# Altium footprint library iv_footprints.PcbLib: 724 footprints (part 42 of 46)
Each footprint in its own frame and in the unit in brackets; x right, y up, seen from the top. Pads: shape width x height; smd on the part's side, far side on the other; paste and mask are expansions set on the pad; w line width, h text height; cw(c..) or ccw(c..) is an arc to the next point about the centre after c.
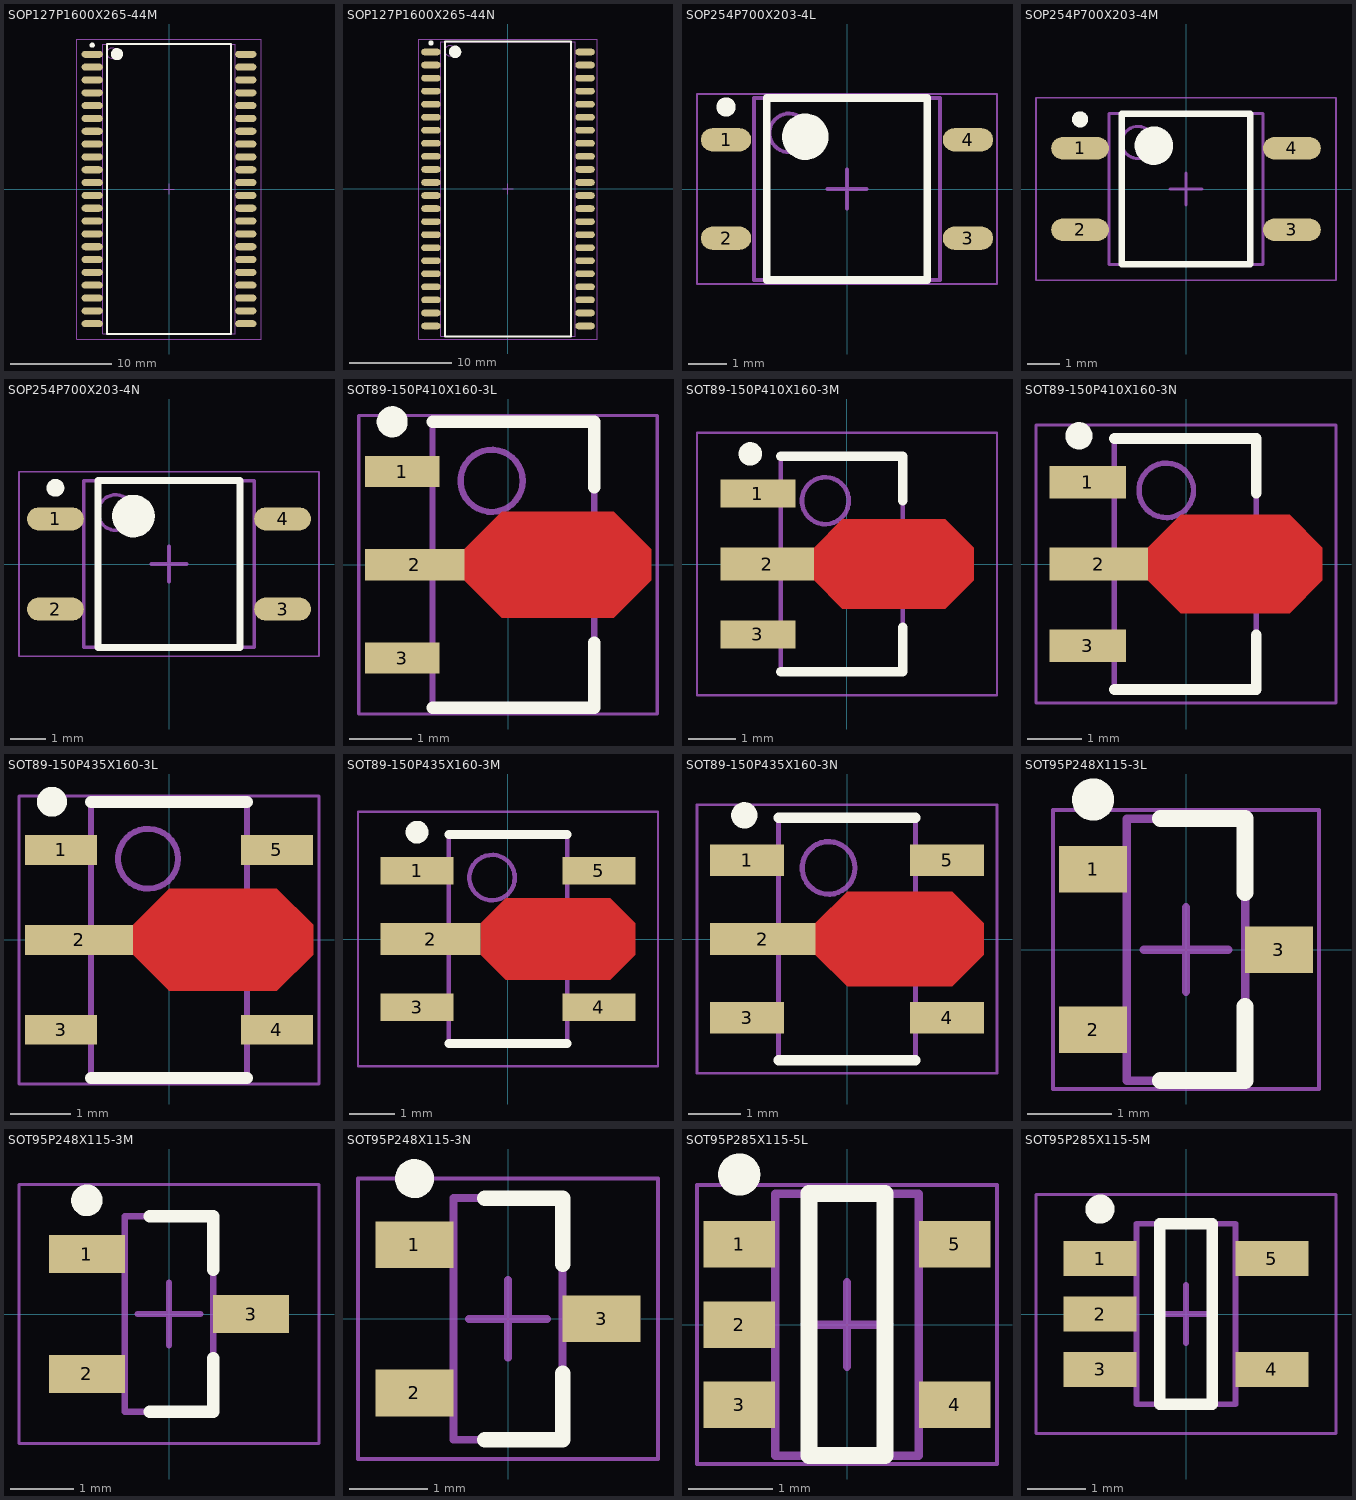
[diagram p41: the footprints below, top view; thin cyan lines are the x and y axes]

## SOP127P1600X265-44M [mm] "SOP, 44-Leads, Body 28.45x13.00mm, Pitch 1.27mm, IPC Low Density"
height 2.65
pads (44):
  oval 2.1x0.7 smd: 1(-7.6,13.335) 2(-7.6,12.065) 3(-7.6,10.795) 4(-7.6,9.525) 5(-7.6,8.255) 6(-7.6,6.985) 7(-7.6,5.715) 8(-7.6,4.445) 9(-7.6,3.175) 10(-7.6,1.905) 11(-7.6,0.635) 12(-7.6,-0.635) 13(-7.6,-1.905) 14(-7.6,-3.175) 15(-7.6,-4.445) 16(-7.6,-5.715) 17(-7.6,-6.985) 18(-7.6,-8.255) 19(-7.6,-9.525) 20(-7.6,-10.795) 21(-7.6,-12.065) 22(-7.6,-13.335) 23(7.6,-13.335) 24(7.6,-12.065) 25(7.6,-10.795) 26(7.6,-9.525) 27(7.6,-8.255) 28(7.6,-6.985) 29(7.6,-5.715) 30(7.6,-4.445) 31(7.6,-3.175) 32(7.6,-1.905) 33(7.6,-0.635) 34(7.6,0.635) 35(7.6,1.905) 36(7.6,3.175) 37(7.6,4.445) 38(7.6,5.715) 39(7.6,6.985) 40(7.6,8.255) 41(7.6,9.525) 42(7.6,10.795) 43(7.6,12.065) 44(7.6,13.335)
Top Overlay:
  circle w0.25: c-7.6,14.235 r0.125
  circle w0.6: c-5.15,13.35 r0.3
  lines w0.2: -6.15,-14.35 -6.15,14.35 6.15,14.35 6.15,-14.35 -6.15,-14.35
Mechanical 13:
  circle w0.1: c-5.65,13.45 r0.5
  lines w0.1: -6.55,-14.35 -6.55,14.35 6.55,14.35 6.55,-14.35 -6.55,-14.35
Mechanical 15:
  lines w0.05: -9.15,-14.85 -9.15,14.85 9.15,14.85 9.15,-14.85 -9.15,-14.85
  lines w0.1: -0.5,0 0.5,0 ; 0,-0.5 0,0.5
3D body "SOP127P1600X265-44M.step": height 2.65, standoff 0, extent -8,-14.35 8,14.35

## SOP127P1600X265-44N [mm] "SOP, 44-Leads, Body 28.45x13.00mm, Pitch 1.27mm, IPC Medium Density"
height 2.65
pads (44):
  oval 1.9x0.65 smd: 1(-7.5,13.335) 2(-7.5,12.065) 3(-7.5,10.795) 4(-7.5,9.525) 5(-7.5,8.255) 6(-7.5,6.985) 7(-7.5,5.715) 8(-7.5,4.445) 9(-7.5,3.175) 10(-7.5,1.905) 11(-7.5,0.635) 12(-7.5,-0.635) 13(-7.5,-1.905) 14(-7.5,-3.175) 15(-7.5,-4.445) 16(-7.5,-5.715) 17(-7.5,-6.985) 18(-7.5,-8.255) 19(-7.5,-9.525) 20(-7.5,-10.795) 21(-7.5,-12.065) 22(-7.5,-13.335) 23(7.5,-13.335) 24(7.5,-12.065) 25(7.5,-10.795) 26(7.5,-9.525) 27(7.5,-8.255) 28(7.5,-6.985) 29(7.5,-5.715) 30(7.5,-4.445) 31(7.5,-3.175) 32(7.5,-1.905) 33(7.5,-0.635) 34(7.5,0.635) 35(7.5,1.905) 36(7.5,3.175) 37(7.5,4.445) 38(7.5,5.715) 39(7.5,6.985) 40(7.5,8.255) 41(7.5,9.525) 42(7.5,10.795) 43(7.5,12.065) 44(7.5,13.335)
Top Overlay:
  circle w0.25: c-7.5,14.21 r0.125
  circle w0.6: c-5.15,13.35 r0.3
  lines w0.2: -6.15,-14.35 -6.15,14.35 6.15,14.35 6.15,-14.35 -6.15,-14.35
Mechanical 13:
  circle w0.1: c-5.65,13.45 r0.5
  lines w0.1: -6.55,-14.35 -6.55,14.35 6.55,14.35 6.55,-14.35 -6.55,-14.35
Mechanical 15:
  lines w0.05: -8.7,-14.6 -8.7,14.6 8.7,14.6 8.7,-14.6 -8.7,-14.6
  lines w0.1: -0.5,0 0.5,0 ; 0,-0.5 0,0.5
3D body "SOP127P1600X265-44N.step": height 2.65, standoff 0, extent -8,-14.35 8,14.35

## SOP254P700X203-4L [mm] "SOP, 4-Leads, Body 4.42x4.58mm, Pitch 2.54mm, IPC High Density"
height 2.03
pads (4):
  oval 1.3x0.6 smd: 1(-3.125,1.27) 2(-3.125,-1.27) 3(3.125,-1.27) 4(3.125,1.27)
Top Overlay:
  circle w0.6: c-1.075,1.35 r0.3
  circle w0.25: c-3.125,2.12 r0.125
  lines w0.2: -2.075,-2.35 2.075,-2.35 2.075,2.35 -2.075,2.35 -2.075,-2.35
Mechanical 13:
  circle w0.1: c-1.5,1.45 r0.5
  lines w0.1: -2.4,-2.35 2.4,-2.35 2.4,2.35 -2.4,2.35 -2.4,-2.35
Mechanical 15:
  lines w0.05: -3.875,-2.45 3.875,-2.45 3.875,2.45 -3.875,2.45 -3.875,-2.45
  lines w0.1: -0.5,0 0.5,0 ; 0,-0.5 0,0.5
3D body "SOP254P700X203-4L.step": height 2.03, standoff 0, extent -3.48,-2.35 3.48,2.35

## SOP254P700X203-4M [mm] "SOP, 4-Leads, Body 4.42x4.58mm, Pitch 2.54mm, IPC Low Density"
height 2.03
pads (4):
  oval 1.8x0.7 smd: 1(-3.3,1.27) 2(-3.3,-1.27) 3(3.3,-1.27) 4(3.3,1.27)
Top Overlay:
  circle w0.25: c-3.3,2.17 r0.125
  circle w0.6: c-1,1.35 r0.3
  lines w0.2: -2,-2.35 -2,2.35 2,2.35 2,-2.35 -2,-2.35
Mechanical 13:
  circle w0.1: c-1.5,1.45 r0.5
  lines w0.1: -2.4,-2.35 -2.4,2.35 2.4,2.35 2.4,-2.35 -2.4,-2.35
Mechanical 15:
  lines w0.05: -4.675,-2.85 -4.675,2.85 4.675,2.85 4.675,-2.85 -4.675,-2.85
  lines w0.1: -0.5,0 0.5,0 ; 0,-0.5 0,0.5
3D body "SOP254P700X203-4M.step": height 2.03, standoff 0, extent -3.48,-2.35 3.48,2.35

## SOP254P700X203-4N [mm] "SOP, 4-Leads, Body 4.42x4.58mm, Pitch 2.54mm, IPC Medium Density"
height 2.03
pads (4):
  oval 1.6x0.65 smd: 1(-3.2,1.27) 2(-3.2,-1.27) 3(3.2,-1.27) 4(3.2,1.27)
Top Overlay:
  circle w0.25: c-3.2,2.145 r0.125
  circle w0.6: c-1,1.35 r0.3
  lines w0.2: -2,-2.35 -2,2.35 2,2.35 2,-2.35 -2,-2.35
Mechanical 13:
  circle w0.1: c-1.5,1.45 r0.5
  lines w0.1: -2.4,-2.35 -2.4,2.35 2.4,2.35 2.4,-2.35 -2.4,-2.35
Mechanical 15:
  lines w0.05: -4.225,-2.6 -4.225,2.6 4.225,2.6 4.225,-2.6 -4.225,-2.6
  lines w0.1: -0.5,0 0.5,0 ; 0,-0.5 0,0.5
3D body "SOP254P700X203-4N.step": height 2.03, standoff 0, extent -3.48,-2.35 3.48,2.35

## SOT89-150P410X160-3L [mm] "SOT89, 3-Leads, Body 4,50x2,45mm, Pitch 1,50mm, Lead Span 4,1mm, IPC High Density"
height 1.6
pads (3):
  rect 1.2x0.5 smd: 1(-1.7,1.5) 3(-1.7,-1.5)
  rect 1.6x0.5 smd: 2(-1.5,0)
Top Layer:
  region: -0.7,0.25 -0.1,0.85 1.7,0.85 2.3,0.25 2.3,-0.25 1.7,-0.85 -0.1,-0.85 -0.7,-0.25
Top Overlay:
  circle w0.25: c-1.863,2.3 r0.125
  lines w0.2: -1.212,-2.3 1.388,-2.3 1.388,-1.25 ; -1.212,2.3 1.388,2.3 1.388,1.25
Mechanical 13:
  circle w0.1: c-0.262,1.35 r0.5
  lines w0.1: -1.212,-2.3 -1.212,2.3 1.388,2.3 1.388,-2.3 -1.212,-2.3
Mechanical 15:
  lines w0.05: -2.4,-2.4 -2.4,2.4 2.4,2.4 2.4,-2.4 -2.4,-2.4
  lines w0.1: -0.413,0 0.587,0 ; 0.088,-0.5 0.088,0.5
3D body "SOT89-150P410X160-3L.step": height 1.6, standoff 0, extent -2.2,-2.3 1.85,2.3

## SOT89-150P410X160-3M [mm] "SOT89, 3-Leads, Body 4,50x2,45mm, Pitch 1,50mm, Lead Span 4,1mm, IPC Low Density"
height 1.6
pads (3):
  rect 1.6x0.6 smd: 1(-1.9,1.5) 3(-1.9,-1.5)
  rect 2x0.7 smd: 2(-1.7,0)
Top Layer:
  region: -0.7,0.35 -0.1,0.95 2.1,0.95 2.7,0.35 2.7,-0.35 2.1,-0.95 -0.1,-0.95 -0.7,-0.35
Top Overlay:
  circle w0.25: c-2.063,2.35 r0.125
  lines w0.2: -1.412,-2.3 1.188,-2.3 1.188,-1.35 ; -1.412,2.3 1.188,2.3 1.188,1.35
Mechanical 13:
  circle w0.1: c-0.462,1.35 r0.5
  lines w0.1: -1.412,-2.3 -1.412,2.3 1.188,2.3 1.188,-2.3 -1.412,-2.3
Mechanical 15:
  lines w0.05: -3.2,-2.8 -3.2,2.8 3.2,2.8 3.2,-2.8 -3.2,-2.8
  lines w0.1: -0.613,0 0.387,0 ; -0.112,-0.5 -0.112,0.5
3D body "SOT89-150P410X160-3M.step": height 1.6, standoff 0, extent -2.2,-2.3 1.85,2.3

## SOT89-150P410X160-3N [mm] "SOT89, 3-Leads, Body 4,50x2,45mm, Pitch 1,50mm, Lead Span 4,1mm, IPC Medium Density"
height 1.6
pads (3):
  rect 1.4x0.6 smd: 1(-1.8,1.5) 3(-1.8,-1.5)
  rect 1.8x0.6 smd: 2(-1.6,0)
Top Layer:
  region: -0.7,0.3 -0.1,0.9 1.9,0.9 2.5,0.3 2.5,-0.3 1.9,-0.9 -0.1,-0.9 -0.7,-0.3
Top Overlay:
  circle w0.25: c-1.963,2.35 r0.125
  lines w0.2: -1.312,-2.3 1.288,-2.3 1.288,-1.3 ; -1.312,2.3 1.288,2.3 1.288,1.3
Mechanical 13:
  circle w0.1: c-0.362,1.35 r0.5
  lines w0.1: -1.312,-2.3 -1.312,2.3 1.288,2.3 1.288,-2.3 -1.312,-2.3
Mechanical 15:
  lines w0.05: -2.75,-2.55 -2.75,2.55 2.75,2.55 2.75,-2.55 -2.75,-2.55
  lines w0.1: -0.513,0 0.487,0 ; -0.012,-0.5 -0.012,0.5
3D body "SOT89-150P410X160-3N.step": height 1.6, standoff 0, extent -2.2,-2.3 1.85,2.3

## SOT89-150P435X160-3L [mm] "SOT89, 3-Leads, Body 4,50x2,45mm, Pitch 1,50mm, Lead Span 4,4mm, IPC High Density"
height 1.6
pads (5):
  rect 1.2x0.5 smd: 1(-1.8,1.5) 3(-1.8,-1.5) 4(1.8,-1.5) 5(1.8,1.5)
  rect 1.8x0.5 smd: 2(-1.5,0)
Top Layer:
  region: -0.6,0.25 0,0.85 1.8,0.85 2.4,0.25 2.4,-0.25 1.8,-0.85 0,-0.85 -0.6,-0.25
Top Overlay:
  circle w0.25: c-1.95,2.3 r0.125
  lines w0.2: -1.3,-2.3 1.3,-2.3 ; -1.3,2.3 1.3,2.3
Mechanical 13:
  circle w0.1: c-0.35,1.35 r0.5
  lines w0.1: -1.3,-2.3 1.3,-2.3 1.3,2.3 -1.3,2.3 -1.3,-2.3
Mechanical 15:
  lines w0.05: -2.5,-2.4 2.5,-2.4 2.5,2.4 -2.5,2.4 -2.5,-2.4
  lines w0.1: -0.5,0 0.5,0 ; 0,-0.5 0,0.5
3D body "SOT89-150P435X160-3L.step": height 1.6, standoff 0, extent -2.2,-2.3 1.85,2.3

## SOT89-150P435X160-3M [mm] "SOT89, 3-Leads, Body 4,50x2,45mm, Pitch 1,50mm, Lead Span 4,4mm, IPC Low Density"
height 1.6
pads (5):
  rect 1.6x0.6 smd: 1(-2,1.5) 3(-2,-1.5) 4(2,-1.5) 5(2,1.5)
  rect 2.2x0.7 smd: 2(-1.7,0)
Top Layer:
  region: -0.6,0.35 -0.05,0.9 2.25,0.9 2.8,0.35 2.8,-0.35 2.25,-0.9 -0.05,-0.9 -0.6,-0.35
Top Overlay:
  circle w0.25: c-2,2.35 r0.125
  lines w0.2: -1.3,-2.3 1.3,-2.3 ; -1.3,2.3 1.3,2.3
Mechanical 13:
  circle w0.1: c-0.35,1.35 r0.5
  lines w0.1: -1.3,-2.3 1.3,-2.3 1.3,2.3 -1.3,2.3 -1.3,-2.3
Mechanical 15:
  lines w0.05: -3.3,-2.8 3.3,-2.8 3.3,2.8 -3.3,2.8 -3.3,-2.8
  lines w0.1: -0.5,0 0.5,0 ; 0,-0.5 0,0.5
3D body "SOT89-150P435X160-3M.step": height 1.6, standoff 0, extent -2.2,-2.3 1.85,2.3

## SOT89-150P435X160-3N [mm] "SOT89, 3-Leads, Body 4,50x2,45mm, Pitch 1,50mm, Lead Span 4,4mm, IPC Medium Density"
height 1.6
pads (5):
  rect 1.4x0.6 smd: 1(-1.9,1.5) 3(-1.9,-1.5) 4(1.9,-1.5) 5(1.9,1.5)
  rect 2x0.6 smd: 2(-1.6,0)
Top Layer:
  region: -0.6,0.3 0,0.9 2,0.9 2.6,0.3 2.6,-0.3 2,-0.9 0,-0.9 -0.6,-0.3
Top Overlay:
  circle w0.25: c-1.95,2.35 r0.125
  lines w0.2: -1.3,-2.3 1.3,-2.3 ; -1.3,2.3 1.3,2.3
Mechanical 13:
  circle w0.1: c-0.35,1.35 r0.5
  lines w0.1: -1.3,-2.3 -1.3,2.3 1.3,2.3 1.3,-2.3 -1.3,-2.3
Mechanical 15:
  lines w0.05: -2.85,-2.55 -2.85,2.55 2.85,2.55 2.85,-2.55 -2.85,-2.55
  lines w0.1: -0.5,0 0.5,0 ; 0,-0.5 0,0.5
3D body "SOT89-150P435X160-3N.step": height 1.6, standoff 0, extent -2.2,-2.3 1.85,2.3

## SOT95P248X115-3L [mm] "SOT23, 3-Leads, Body 2,95x2,48mm, Pitch 0,95mm, IPC High Density"
height 1.15
pads (3):
  rect 0.8x0.55 smd: 1(-1.1,0.95) 2(-1.1,-0.95) 3(1.1,0)
Top Overlay:
  circle w0.25: c-1.1,1.775 r0.125
  lines w0.2: -0.3,-1.55 0.7,-1.55 0.7,-0.675 ; -0.3,1.55 0.7,1.55 0.7,0.675
Mechanical 13:
  lines w0.1: -0.7,-1.55 0.7,-1.55 0.7,1.55 -0.7,1.55 -0.7,-1.55
Mechanical 15:
  lines w0.05: -1.575,-1.65 1.575,-1.65 1.575,1.65 -1.575,1.65 -1.575,-1.65
  lines w0.1: -0.5,0 0.5,0 ; 0,-0.5 0,0.5
3D body "SOT95P248X115-3L.step": height 1.15, standoff 0, extent -1.3,-1.55 1.3,1.55

## SOT95P248X115-3M [mm] "SOT23, 3-Leads, Body 2,95x2,48mm, Pitch 0,95mm, IPC Low Density"
height 1.15
pads (3):
  rect 1.2x0.6 smd: 1(-1.3,0.95) 2(-1.3,-0.95) 3(1.3,0)
Top Overlay:
  circle w0.25: c-1.3,1.8 r0.125
  lines w0.2: -0.3,-1.55 0.7,-1.55 0.7,-0.7 ; -0.3,1.55 0.7,1.55 0.7,0.7
Mechanical 13:
  lines w0.1: -0.7,-1.55 0.7,-1.55 0.7,1.55 -0.7,1.55 -0.7,-1.55
Mechanical 15:
  lines w0.05: -2.375,-2.05 2.375,-2.05 2.375,2.05 -2.375,2.05 -2.375,-2.05
  lines w0.1: -0.5,0 0.5,0 ; 0,-0.5 0,0.5
3D body "SOT95P248X115-3M.step": height 1.15, standoff 0, extent -1.3,-1.55 1.3,1.55

## SOT95P248X115-3N [mm] "SOT23, 3-Leads, Body 2,95x2,48mm, Pitch 0,95mm, IPC Medium Density"
height 1.15
pads (3):
  rect 1x0.6 smd: 1(-1.2,0.95) 2(-1.2,-0.95) 3(1.2,0)
Top Overlay:
  circle w0.25: c-1.2,1.8 r0.125
  lines w0.2: -0.3,-1.55 0.7,-1.55 0.7,-0.7 ; -0.3,1.55 0.7,1.55 0.7,0.7
Mechanical 13:
  lines w0.1: -0.7,-1.55 -0.7,1.55 0.7,1.55 0.7,-1.55 -0.7,-1.55
Mechanical 15:
  lines w0.05: -1.925,-1.8 -1.925,1.8 1.925,1.8 1.925,-1.8 -1.925,-1.8
  lines w0.1: -0.5,0 0.5,0 ; 0,-0.5 0,0.5
3D body "SOT95P248X115-3N.step": height 1.15, standoff 0, extent -1.3,-1.55 1.3,1.55

## SOT95P285X115-5L [mm] "SOT23, 5-Leads, Body 2,95x2,85mm, Pitch 0,95mm, IPC High Density"
height 1.15
pads (5):
  rect 0.85x0.55 smd: 1(-1.275,0.95) 2(-1.275,0) 3(-1.275,-0.95) 4(1.275,-0.95) 5(1.275,0.95)
Top Overlay:
  circle w0.25: c-1.275,1.775 r0.125
  lines w0.2: -0.45,-1.55 -0.45,1.55 0.45,1.55 0.45,-1.55 -0.45,-1.55
Mechanical 13:
  lines w0.1: -0.85,-1.55 0.85,-1.55 0.85,1.55 -0.85,1.55 -0.85,-1.55
Mechanical 15:
  lines w0.05: -1.775,-1.65 1.775,-1.65 1.775,1.65 -1.775,1.65 -1.775,-1.65
  lines w0.1: -0.5,0 0.5,0 ; 0,-0.5 0,0.5
3D body "SOT95P285X115-5L.step": height 1.15, standoff 0, extent -1.5,-1.55 1.5,1.55

## SOT95P285X115-5M [mm] "SOT23, 5-Leads, Body 2,95x2,85mm, Pitch 0,95mm, IPC Low Density"
height 1.15
pads (5):
  rect 1.25x0.6 smd: 1(-1.475,0.95) 2(-1.475,0) 3(-1.475,-0.95) 4(1.475,-0.95) 5(1.475,0.95)
Top Overlay:
  circle w0.25: c-1.475,1.8 r0.125
  lines w0.2: -0.45,-1.55 -0.45,1.55 0.45,1.55 0.45,-1.55 -0.45,-1.55
Mechanical 13:
  lines w0.1: -0.85,-1.55 0.85,-1.55 0.85,1.55 -0.85,1.55 -0.85,-1.55
Mechanical 15:
  lines w0.05: -2.575,-2.05 2.575,-2.05 2.575,2.05 -2.575,2.05 -2.575,-2.05
  lines w0.1: -0.5,0 0.5,0 ; 0,-0.5 0,0.5
3D body "SOT95P285X115-5M.step": height 1.15, standoff 0, extent -1.5,-1.55 1.5,1.55